# Altium footprint library ie-track-kit-arduino-1.PcbLib: 53 footprints (part 1 of 4)
Each footprint in its own frame and in the unit in brackets; x right, y up, seen from the top. Pads: shape width x height; smd on the part's side, far side on the other; paste and mask are expansions set on the pad; w line width, h text height; cw(c..) or ccw(c..) is an arc to the next point about the centre after c.
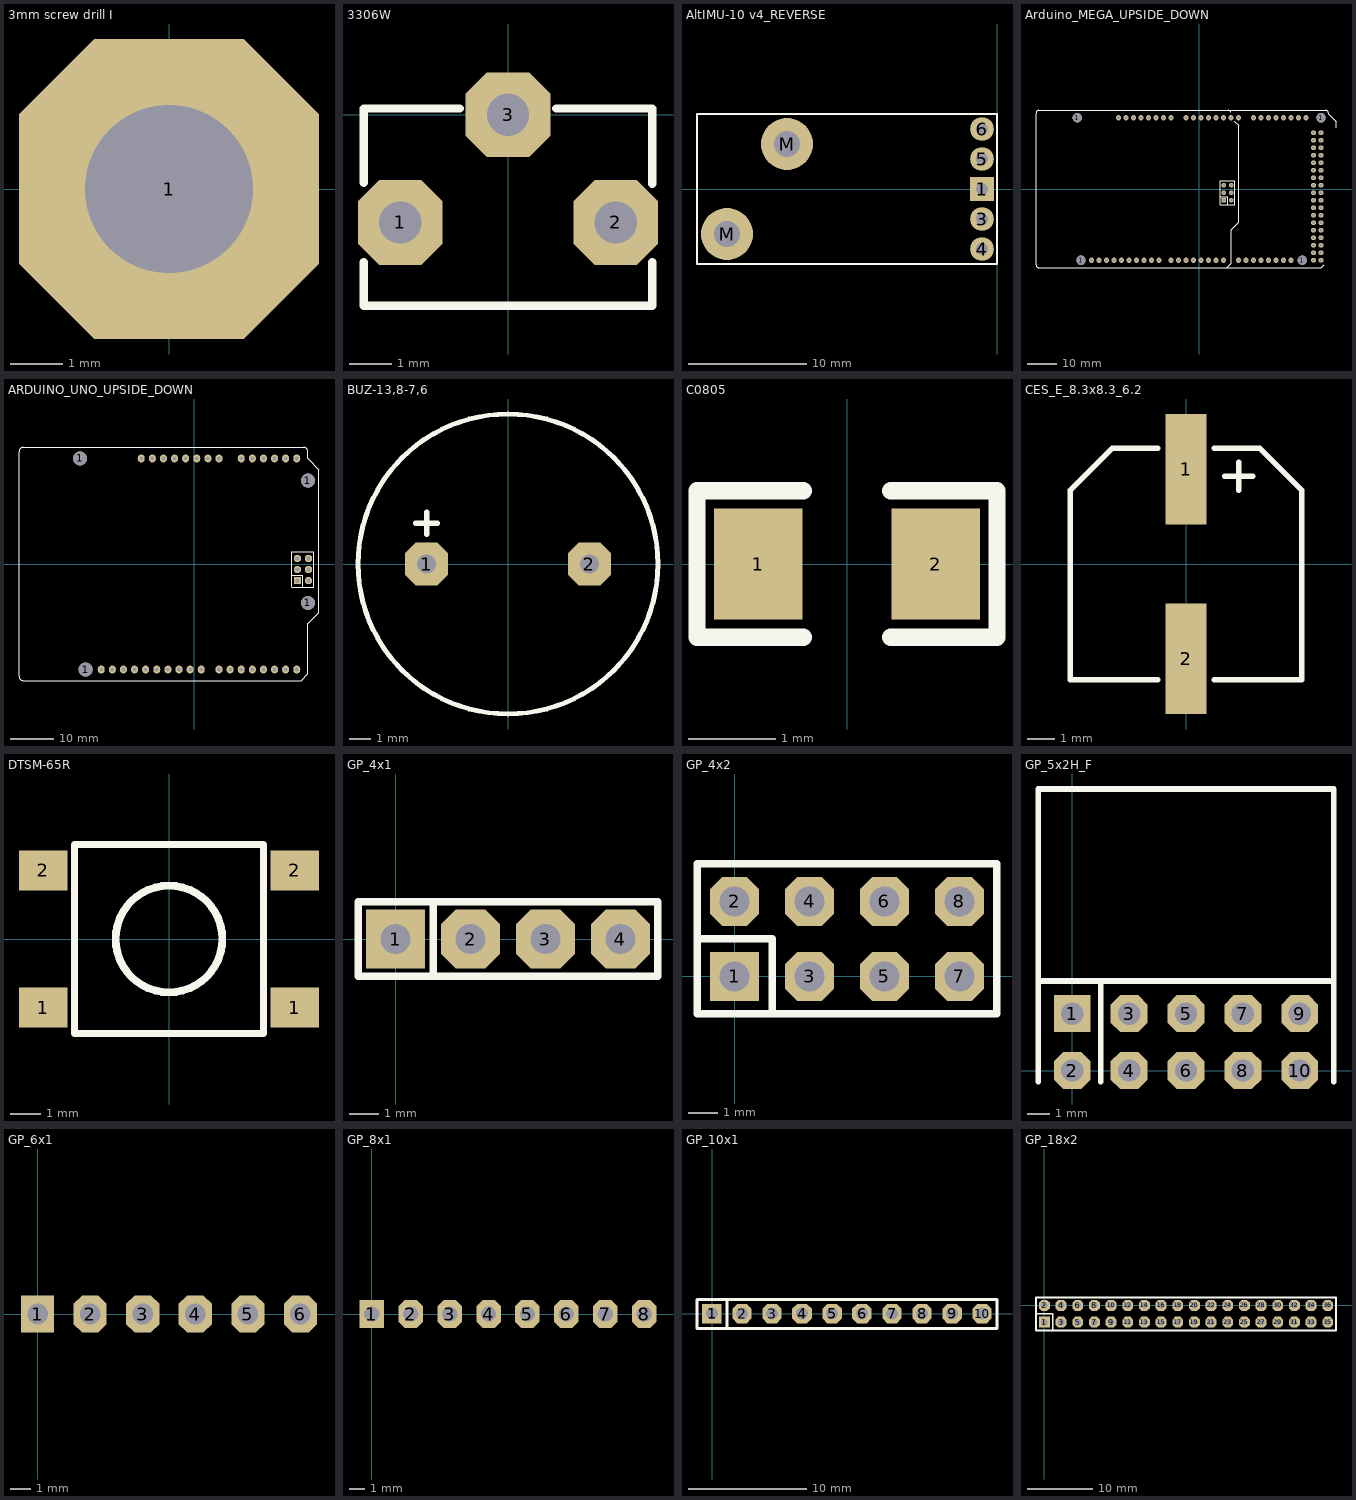
[diagram p0: the footprints below, top view; thin cyan lines are the x and y axes]

## 3mm screw drill I [mm]
height 1.6
pads (1):
  oct 5.7x5.7 hole 3.2: 1(0,0)
3D body "M3x4.step": height 2, standoff -4, extent -2.75,-2.75 2.75,2.75

## 3306W [mm] "Bourns, 6mm Round Vertical Trimming Potentiometer, Single-Turn, Cermet"
height 7.5
pads (3):
  oct 2x2 hole 1: 1(-2.54,-2.54) 2(2.54,-2.54) 3(0,0)
Top Overlay:
  lines w0.2: -3.4,-3.475 -3.405,-3.48 -3.405,-4.5 3.405,-4.5 3.405,-3.48 3.4,-3.475 ; -3.4,-1.6 -3.4,0.15 -1.143,0.15 ; 1.143,0.15 3.4,0.15 3.4,-1.625
3D body "User Library-POT-3306W.step": height 8.4, standoff -1.91, extent -3.405,-4.5 3.405,0.15

## AltIMU-10 v4_REVERSE [mm] "Pololu Gyro, Accelerometer, Compass, and Altimeter (L3GD20H, LSM303D, and LPS25H Carrier)"
pads (7):
  rect 2x2 hole 1: 1(-1.27,0)
  round 2 hole 1: 3(-1.27,-2.54) 4(-1.27,-5.08) 5(-1.27,2.54) 6(-1.27,5.08)
  round 4.4 hole 2.2: M(-22.86,-3.81) M(-17.78,3.81)
Top Overlay:
  lines w0.2: -25.4,-6.35 0,-6.35 0,6.35 -25.4,6.35 -25.4,-6.35
3D body: height 1, standoff 0, extent -25.4,-6.35 0,6.35

## Arduino_MEGA_UPSIDE_DOWN [mm]
pads (96):
  round 3.2 hole 3.2: 1(-41.275,24.13) 1(-40.005,-24.13) 1(34.925,-24.13) 1(41.275,24.13)
  oct 1.6x1.6 hole 0.95: 5V(38.735,-24.13) 5V(41.275,-24.13) D22(38.735,-21.59) D23(41.275,-21.59) D24(38.735,-19.05) D25(41.275,-19.05) D26(38.735,-16.51) D27(41.275,-16.51) D28(38.735,-13.97) D29(41.275,-13.97) D30(38.735,-11.43) D31(41.275,-11.43) D32(38.735,-8.89) D33(41.275,-8.89) D34(38.735,-6.35) D35(41.275,-6.35) D36(38.735,-3.81) D37(41.275,-3.81) D38(38.735,-1.27) D39(41.275,-1.27) D40(38.735,1.27) D41(41.275,1.27) D42(38.735,3.81) D43(41.275,3.81) D44(38.735,6.35) D45(41.275,6.35) D46(38.735,8.89) D47(41.275,8.89) D48(38.735,11.43) D49(41.275,11.43) D50(38.735,13.97) D51(41.275,13.97) D52(38.735,16.51) D53(41.275,16.51) GND(38.735,19.05) GND(41.275,19.05)
  oval 1.6x1.8 hole 0.85: A0(-4.445,24.13) A1(-1.905,24.13) A2(0.635,24.13) A3(3.175,24.13) A4(5.715,24.13) A5(8.255,24.13) A6(10.795,24.13) A7(13.335,24.13) A8(18.415,24.13) A9(20.955,24.13) A10(23.495,24.13) A11(26.035,24.13) A12(28.575,24.13) A13(31.115,24.13) A14(33.655,24.13) A15(36.195,24.13) AREF(-31.369,-24.13) D0(8.255,-24.13) D1(5.715,-24.13) D2(3.175,-24.13) D3(0.635,-24.13) D4(-1.905,-24.13) D5(-4.445,-24.13) D6(-6.985,-24.13) D7(-9.525,-24.13) D8(-13.589,-24.13) D9(-16.129,-24.13) D10(-18.669,-24.13) D11(-21.209,-24.13) D12(-23.749,-24.13) D13(-26.289,-24.13) D14(13.335,-24.13) D15(15.875,-24.13) D16(18.415,-24.13) D17(20.955,-24.13) D18(23.495,-24.13) D19(26.035,-24.13) D20(28.575,-24.13) D21(31.115,-24.13) GND(-28.829,-24.13) P1(-27.305,24.13) P2(-24.765,24.13) P3(-22.225,24.13) P4(-19.685,24.13) P5(-17.145,24.13) P6(-14.605,24.13) P7(-12.065,24.13) P8(-9.525,24.13) SCL(-36.449,-24.13) SDA(-33.909,-24.13)
  rect 1.6x1.6 hole 1: PROG1(8.382,-3.81)
  oct 1.6x1.6 hole 1: PROG2(10.922,-3.81) PROG3(8.382,-1.27) PROG4(10.922,-1.27) PROG5(8.382,1.27) PROG6(10.922,1.27)
Top Overlay:
  lines w0.2: 46.355,20.828 46.355,22.86
  lines w0.254: 7.151,-5.31 7.151,2.79 12.122,2.79 12.122,-5.31 7.222,-5.31 ; 7.151,-2.54 9.652,-2.54 9.652,-5.31 ; 9.271,-26.67 10.795,-25.146 10.795,-13.716 13.335,-11.176 13.335,21.59 11.962,22.963 ; 9.795,26.67 cw(c9.795,25.67) 10.745,25.983 ; 42.355,-25.59 41.275,-26.67 -54.245,-26.67 cw(c-54.245,-25.67) -55.245,-25.67 -55.245,25.67 cw(c-54.245,25.67) -54.245,26.67 42.815,26.67 cw(c42.815,25.67) 43.815,25.67 43.815,25.4 46.355,22.86
Mechanical 16:
  region: -9.271,-23.876 -9.779,-23.876 -9.779,-24.384 -9.271,-24.384
  region: 8.509,-23.876 8.001,-23.876 8.001,-24.384 8.509,-24.384
  region: 5.969,-23.876 5.461,-23.876 5.461,-24.384 5.969,-24.384
  region: 3.429,-23.876 2.921,-23.876 2.921,-24.384 3.429,-24.384
  region: 0.889,-23.876 0.381,-23.876 0.381,-24.384 0.889,-24.384
  region: -1.651,-23.876 -2.159,-23.876 -2.159,-24.384 -1.651,-24.384
  region: -4.191,-23.876 -4.699,-23.876 -4.699,-24.384 -4.191,-24.384
  region: -6.731,-23.876 -7.239,-23.876 -7.239,-24.384 -6.731,-24.384
  rectangle: 13.081,23.876 13.589,24.384
  rectangle: -4.699,23.876 -4.191,24.384
  rectangle: -2.159,23.876 -1.651,24.384
  rectangle: 0.381,23.876 0.889,24.384
  rectangle: 2.921,23.876 3.429,24.384
  rectangle: 5.461,23.876 5.969,24.384
  rectangle: 8.001,23.876 8.509,24.384
  rectangle: 10.541,23.876 11.049,24.384
  region: 13.589,-23.876 13.081,-23.876 13.081,-24.384 13.589,-24.384
  region: 31.369,-23.876 30.861,-23.876 30.861,-24.384 31.369,-24.384
  region: 28.829,-23.876 28.321,-23.876 28.321,-24.384 28.829,-24.384
  region: 26.289,-23.876 25.781,-23.876 25.781,-24.384 26.289,-24.384
  region: 23.749,-23.876 23.241,-23.876 23.241,-24.384 23.749,-24.384
  region: 21.209,-23.876 20.701,-23.876 20.701,-24.384 21.209,-24.384
  region: 18.669,-23.876 18.161,-23.876 18.161,-24.384 18.669,-24.384
  region: 16.129,-23.876 15.621,-23.876 15.621,-24.384 16.129,-24.384
  rectangle: 35.941,23.876 36.449,24.384
  rectangle: 18.161,23.876 18.669,24.384
  rectangle: 20.701,23.876 21.209,24.384
  rectangle: 23.241,23.876 23.749,24.384
  rectangle: 25.781,23.876 26.289,24.384
  rectangle: 28.321,23.876 28.829,24.384
  rectangle: 30.861,23.876 31.369,24.384
  rectangle: 33.401,23.876 33.909,24.384
  region: 38.989,18.796 38.989,19.304 38.481,19.304 38.481,18.796
  region: 41.529,18.796 41.529,19.304 41.021,19.304 41.021,18.796
  region: 38.989,16.256 38.989,16.764 38.481,16.764 38.481,16.256
  region: 41.529,16.256 41.529,16.764 41.021,16.764 41.021,16.256
  region: 38.989,13.716 38.989,14.224 38.481,14.224 38.481,13.716
  region: 41.529,13.716 41.529,14.224 41.021,14.224 41.021,13.716
  region: 38.989,11.176 38.989,11.684 38.481,11.684 38.481,11.176
  region: 41.529,11.176 41.529,11.684 41.021,11.684 41.021,11.176
  region: 38.989,8.636 38.989,9.144 38.481,9.144 38.481,8.636
  region: 41.529,8.636 41.529,9.144 41.021,9.144 41.021,8.636
  region: 38.989,6.096 38.989,6.604 38.481,6.604 38.481,6.096
  region: 41.529,6.096 41.529,6.604 41.021,6.604 41.021,6.096
  region: 38.989,3.556 38.989,4.064 38.481,4.064 38.481,3.556
  region: 41.529,3.556 41.529,4.064 41.021,4.064 41.021,3.556
  region: 38.989,1.016 38.989,1.524 38.481,1.524 38.481,1.016
  region: 41.529,1.016 41.529,1.524 41.021,1.524 41.021,1.016
  region: 38.989,-1.524 38.989,-1.016 38.481,-1.016 38.481,-1.524
  region: 41.529,-1.524 41.529,-1.016 41.021,-1.016 41.021,-1.524
  region: 38.989,-4.064 38.989,-3.556 38.481,-3.556 38.481,-4.064
  region: 41.529,-4.064 41.529,-3.556 41.021,-3.556 41.021,-4.064
  region: 38.989,-6.604 38.989,-6.096 38.481,-6.096 38.481,-6.604
  region: 41.529,-6.604 41.529,-6.096 41.021,-6.096 41.021,-6.604
  region: 38.989,-9.144 38.989,-8.636 38.481,-8.636 38.481,-9.144
  region: 41.529,-9.144 41.529,-8.636 41.021,-8.636 41.021,-9.144
  region: 38.989,-11.684 38.989,-11.176 38.481,-11.176 38.481,-11.684
  region: 38.989,-14.224 38.989,-13.716 38.481,-13.716 38.481,-14.224
  region: 38.989,-16.764 38.989,-16.256 38.481,-16.256 38.481,-16.764
  region: 41.529,-11.684 41.529,-11.176 41.021,-11.176 41.021,-11.684
  region: 41.529,-14.224 41.529,-13.716 41.021,-13.716 41.021,-14.224
  region: 41.529,-16.764 41.529,-16.256 41.021,-16.256 41.021,-16.764
  region: 38.989,-19.304 38.989,-18.796 38.481,-18.796 38.481,-19.304
  region: 41.529,-19.304 41.529,-18.796 41.021,-18.796 41.021,-19.304
  region: 38.989,-21.844 38.989,-21.336 38.481,-21.336 38.481,-21.844
  region: 41.529,-21.844 41.529,-21.336 41.021,-21.336 41.021,-21.844
  region: 41.529,-24.384 41.529,-23.876 41.021,-23.876 41.021,-24.384
  region: 38.989,-24.384 38.989,-23.876 38.481,-23.876 38.481,-24.384
  rectangle: -13.843,-24.384 -13.335,-23.876
  rectangle: -36.703,-24.384 -36.195,-23.876
  rectangle: -34.163,-24.384 -33.655,-23.876
  rectangle: -31.623,-24.384 -31.115,-23.876
  rectangle: -29.083,-24.384 -28.575,-23.876
  rectangle: -26.543,-24.384 -26.035,-23.876
  rectangle: -24.003,-24.384 -23.495,-23.876
  rectangle: -21.463,-24.384 -20.955,-23.876
  rectangle: -18.923,-24.384 -18.415,-23.876
  rectangle: -16.383,-24.384 -15.875,-23.876
  rectangle: -9.779,23.876 -9.271,24.384
  rectangle: -27.559,23.876 -27.051,24.384
  rectangle: -25.019,23.876 -24.511,24.384
  rectangle: -22.479,23.876 -21.971,24.384
  rectangle: -19.939,23.876 -19.431,24.384
  rectangle: -17.399,23.876 -16.891,24.384
  rectangle: -14.859,23.876 -14.351,24.384
  rectangle: -12.319,23.876 -11.811,24.384
3D body "User Library-ARDUINO_MEGA_2560.STEP": height 17.6, standoff 2.35, extent -61.595,-26.67 46.355,26.67
3D body "Samtec-SSW-103-01-G-D.step": height 8.51, standoff -2.64, extent 7.176,-5.334 12.129,2.794

## ARDUINO_UNO_UPSIDE_DOWN [mm]
pads (42):
  round 3.2 hole 3.2: 1(-26.035,24.13) 1(-24.765,-24.13) 1(26.035,-8.89) 1(26.035,19.05)
  oval 1.6x1.8 hole 0.85: A0(10.795,24.13) A1(13.335,24.13) A2(15.875,24.13) A3(18.415,24.13) A4(20.955,24.13) A5(23.495,24.13) AREF(-16.129,-24.13) D0(23.495,-24.13) D1(20.955,-24.13) D2(18.415,-24.13) D3(15.875,-24.13) D4(13.335,-24.13) D5(10.795,-24.13) D6(8.255,-24.13) D7(5.715,-24.13) D8(1.651,-24.13) D9(-0.889,-24.13) D10(-3.429,-24.13) D11(-5.969,-24.13) D12(-8.509,-24.13) D13(-11.049,-24.13) GND(-13.589,-24.13) P1(-12.065,24.13) P2(-9.525,24.13) P3(-6.985,24.13) P4(-4.445,24.13) P5(-1.905,24.13) P6(0.635,24.13) P7(3.175,24.13) P8(5.715,24.13) SCL(-21.209,-24.13) SDA(-18.669,-24.13)
  rect 1.6x1.6 hole 1: PROG1(23.622,-3.81)
  oct 1.6x1.6 hole 1: PROG2(26.162,-3.81) PROG3(23.622,-1.27) PROG4(26.162,-1.27) PROG5(23.622,1.27) PROG6(26.162,1.27)
Top Overlay:
  lines w0.254: 22.391,-5.31 22.391,2.79 27.362,2.79 27.362,-5.31 22.462,-5.31 ; 22.391,-2.54 24.892,-2.54 24.892,-5.31 ; -40.005,-25.67 ccw(c-39.005,-25.67) -39.005,-26.67 24.511,-26.67 26.035,-25.146 26.035,-13.716 28.575,-11.176 28.575,21.59 26.035,24.13 26.035,25.67 ccw(c25.035,25.67) 25.035,26.67 -39.005,26.67 ccw(c-39.005,25.67) -40.005,25.67 -40.005,-25.67
Mechanical 16:
  region: 5.969,-23.876 5.461,-23.876 5.461,-24.384 5.969,-24.384
  region: 23.749,-23.876 23.241,-23.876 23.241,-24.384 23.749,-24.384
  region: 21.209,-23.876 20.701,-23.876 20.701,-24.384 21.209,-24.384
  region: 18.669,-23.876 18.161,-23.876 18.161,-24.384 18.669,-24.384
  region: 16.129,-23.876 15.621,-23.876 15.621,-24.384 16.129,-24.384
  region: 13.589,-23.876 13.081,-23.876 13.081,-24.384 13.589,-24.384
  region: 11.049,-23.876 10.541,-23.876 10.541,-24.384 11.049,-24.384
  region: 8.509,-23.876 8.001,-23.876 8.001,-24.384 8.509,-24.384
  region: -20.955,-23.876 -21.463,-23.876 -21.463,-24.384 -20.955,-24.384
  region: 1.905,-23.876 1.397,-23.876 1.397,-24.384 1.905,-24.384
  region: -0.635,-23.876 -1.143,-23.876 -1.143,-24.384 -0.635,-24.384
  region: -3.175,-23.876 -3.683,-23.876 -3.683,-24.384 -3.175,-24.384
  region: -5.715,-23.876 -6.223,-23.876 -6.223,-24.384 -5.715,-24.384
  region: -8.255,-23.876 -8.763,-23.876 -8.763,-24.384 -8.255,-24.384
  region: -10.795,-23.876 -11.303,-23.876 -11.303,-24.384 -10.795,-24.384
  region: -13.335,-23.876 -13.843,-23.876 -13.843,-24.384 -13.335,-24.384
  region: -15.875,-23.876 -16.383,-23.876 -16.383,-24.384 -15.875,-24.384
  region: -18.415,-23.876 -18.923,-23.876 -18.923,-24.384 -18.415,-24.384
  rectangle: 23.241,23.876 23.749,24.384
  rectangle: 10.541,23.876 11.049,24.384
  rectangle: 13.081,23.876 13.589,24.384
  rectangle: 15.621,23.876 16.129,24.384
  rectangle: 18.161,23.876 18.669,24.384
  rectangle: 20.701,23.876 21.209,24.384
  rectangle: 5.461,23.876 5.969,24.384
  rectangle: -12.319,23.876 -11.811,24.384
  rectangle: -9.779,23.876 -9.271,24.384
  rectangle: -7.239,23.876 -6.731,24.384
  rectangle: -4.699,23.876 -4.191,24.384
  rectangle: -2.159,23.876 -1.651,24.384
  rectangle: 0.381,23.876 0.889,24.384
  rectangle: 2.921,23.876 3.429,24.384
Mechanical 69:
  text "D:/SmartProjects/Snc/a4_bn_logo2.bmp" at -40.005,26.733 h0.02
3D body "Samtec-SSW-103-01-G-D.step": height 8.51, standoff -2.64, extent 22.416,-5.334 27.369,2.794
3D body "User Library-ARDUINO_UNO_R3_1.STEP": height 17.55, standoff 2.3, extent -46.355,-26.67 28.575,26.67

## BUZ-13,8-7,6 [mm] "BUZZER (w or w/o generator), D:13,8mm, P:7,6mm (eg. BPT1412XH7.5)"
height 7.5
pads (2):
  oct 2x2 hole 0.9: 1(-3.8,0) 2(3.8,0)
Top Overlay:
  circle w0.229: c0,0 r7
  lines w0.25: -4.303,1.903 -3.287,1.903 ; -3.795,1.395 -3.795,2.411
3D body "User Library-Buzzer14mm.step": height 7.35, standoff -3.1, extent -7,-7 7,7

## C0805 [mil]
height 49.21
pads (2):
  rect 40x50 smd: 1(-40,0) 2(40,0)
Top Overlay:
  lines w7.87: -19.68,-33 -67.72,-33 -67.72,33 -19.68,33 ; 19.68,-33 67.72,-33 67.72,33 19.68,33
3D body "User Library-0805 SMD Capacitor.step": height 30.79, standoff 0, extent -39.36,-24.6 39.38,24.61

## CES_E_8.3x8.3_6.2 [mm] "SMT Aluminum Electrolytic Capacitor, E Size; base: 8.3x8.3mm, height: 6.2mm"
height 6.2
pads (2):
  rect 1.5x4 smd: 1(0,3.429) 2(0,-3.429)
Top Overlay:
  lines w0.2: -1.016,-4.191 -4.191,-4.191 -4.191,2.667 -2.667,4.191 -1.016,4.191 ; 1.016,-4.191 4.191,-4.191 4.191,2.667 2.667,4.191 1.016,4.191 ; 1.405,3.175 2.413,3.175 ; 1.905,2.675 1.905,3.683
3D body "User Library-ALU-E.STEP": height 6.2, standoff 0, extent -4.15,-4.5 4.15,4.5

## DTSM-65R [mm] "Diptronics SPST-NO, 50mA/12VDC Red TACT Switch"
height 5
pads (4):
  rect 1.6x1.3 smd: 1(-4.125,-2.25) 1(4.125,-2.25) 2(-4.125,2.25) 2(4.125,2.25)
Top Overlay:
  circle w0.254: c0,0 r1.752
  lines w0.229: -3.1,-3.1 -3.1,3.1 3.1,3.1 3.1,-3.1 -3.1,-3.1
3D body "Diptronics_DTSM65_RED.STEP": height 9.55, standoff -0.07, extent -4.544,-3.1 4.544,3.1

## GP_4x1 [mm]
height 9.45
pads (4):
  rect 2x2 hole 1: 1(0,0)
  oct 2x2 hole 1: 2(2.54,0) 3(5.08,0) 4(7.62,0)
Top Overlay:
  lines w0.254: 1.27,-1.27 1.27,1.27 ; -1.27,-1.27 8.89,-1.27 8.89,1.27 -1.27,1.27 -1.27,-1.27
3D body "Samtec-TSW-104-23-F-S.STEP": height 8.38, standoff -2.92, extent -1.27,-1.27 8.89,1.27

## GP_4x2 [mil]
height 228.35
pads (8):
  rect 65x65 hole 39.37: 1(0,0)
  oct 65x65 hole 39.37: 2(0,100) 3(100,0) 4(100,100) 5(200,0) 6(200,100) 7(300,0) 8(300,100)
Top Overlay:
  lines w10: -50,50 50,50 50,-50 ; -50,-50 -50,150 350,150 350,-50 -50,-50
3D body "Samtec-TSW-104-23-F-D.STEP": height 330, standoff -115, extent -50,-50 350,150

## GP_5x2H_F [mil]
height 62.99
pads (10):
  rect 65x65 hole 39.37: 1(0,100)
  oct 65x65 hole 39.37: 2(0,0) 3(100,100) 4(100,0) 5(200,100) 6(200,0) 7(300,100) 8(300,0) 9(400,100) 10(400,0)
Top Overlay:
  lines w10: -60,-20 -60,495 460,495 460,-20 ; -60,157.24 456.69,157.24 ; 50,-20 50,157.24
3D body "Samtec-SSW-105-22-G-D-RA.step": height 197.89, standoff -97.11, extent -59.06,-10.87 460.94,492.13

## GP_6x1 [mm]
pads (6):
  rect 1.6x1.8 hole 1: 1(0,0)
  oct 1.6x1.8 hole 1: 2(2.54,0) 3(5.08,0) 4(7.62,0) 5(10.16,0) 6(12.7,0)
3D body "Samtec-TSW-106-23-F-S.STEP": height 8.38, standoff -2.92, extent -1.27,-1.27 13.97,1.27

## GP_8x1 [mm]
height 1.6
pads (8):
  rect 1.6x1.8 hole 1: 1(0,0)
  oct 1.6x1.8 hole 1: 2(2.54,0) 3(5.08,0) 4(7.62,0) 5(10.16,0) 6(12.7,0) 7(15.24,0) 8(17.78,0)
3D body "Samtec-TSW-108-23-F-S.STEP": height 8.38, standoff -2.92, extent -1.27,-1.27 19.05,1.27

## GP_10x1 [mil]
height 62.99
pads (10):
  rect 65x65 hole 39.37: 1(0,0)
  oct 62.99x65 hole 39.37: 2(100,0) 3(200,0)
  oct 65x65 hole 39.37: 4(300,0) 5(400,0) 6(500,0) 7(600,0) 8(700,0) 9(800,0) 10(900,0)
Top Overlay:
  lines w10: 50,-50 50,47.24 ; -50,-50 -50,47.24 950,47.24 950,-50 -50,-50
3D body "Samtec-TSW-110-23-F-S.STEP": height 330, standoff -115, extent -50,-50 950,50

## GP_18x2 [mil]
height 62.99
pads (36):
  rect 65x65 hole 39.37: 1(0,-100)
  oct 65x65 hole 39.37: 2(0,0) 3(100,-100) 4(100,0) 5(200,-100) 6(200,0) 7(300,-100) 8(300,0) 9(400,-100) 10(400,0) 11(500,-100) 12(500,0) 13(600,-100) 14(600,0) 15(700,-100) 16(700,0) 17(800,-100) 18(800,0) 19(900,-100) 20(900,0) 21(1000,-100) 22(1000,0) 23(1100,-100) 24(1100,0) 25(1200,-100) 26(1200,0) 27(1300,-100) 28(1300,0) 29(1400,-100) 30(1400,0) 31(1500,-100) 32(1500,0) 33(1600,-100) 34(1600,0) 35(1700,-100) 36(1700,0)
Top Overlay:
  lines w10: -50,-50 50,-50 50,-150 ; -50,-150 1750,-150 1750,47.24 -50,47.24 -50,-150
3D body "Samtec-TSW-118-23-F-D.STEP": height 330, standoff -115, extent -50,-150 1750,50